# Altium footprint library lib_protel_HC.PCBLIB: 724 footprints (part 34 of 46)
Each footprint in its own frame and in the unit in brackets; x right, y up, seen from the top. Pads: shape width x height; smd on the part's side, far side on the other; paste and mask are expansions set on the pad; w line width, h text height; cw(c..) or ccw(c..) is an arc to the next point about the centre after c.
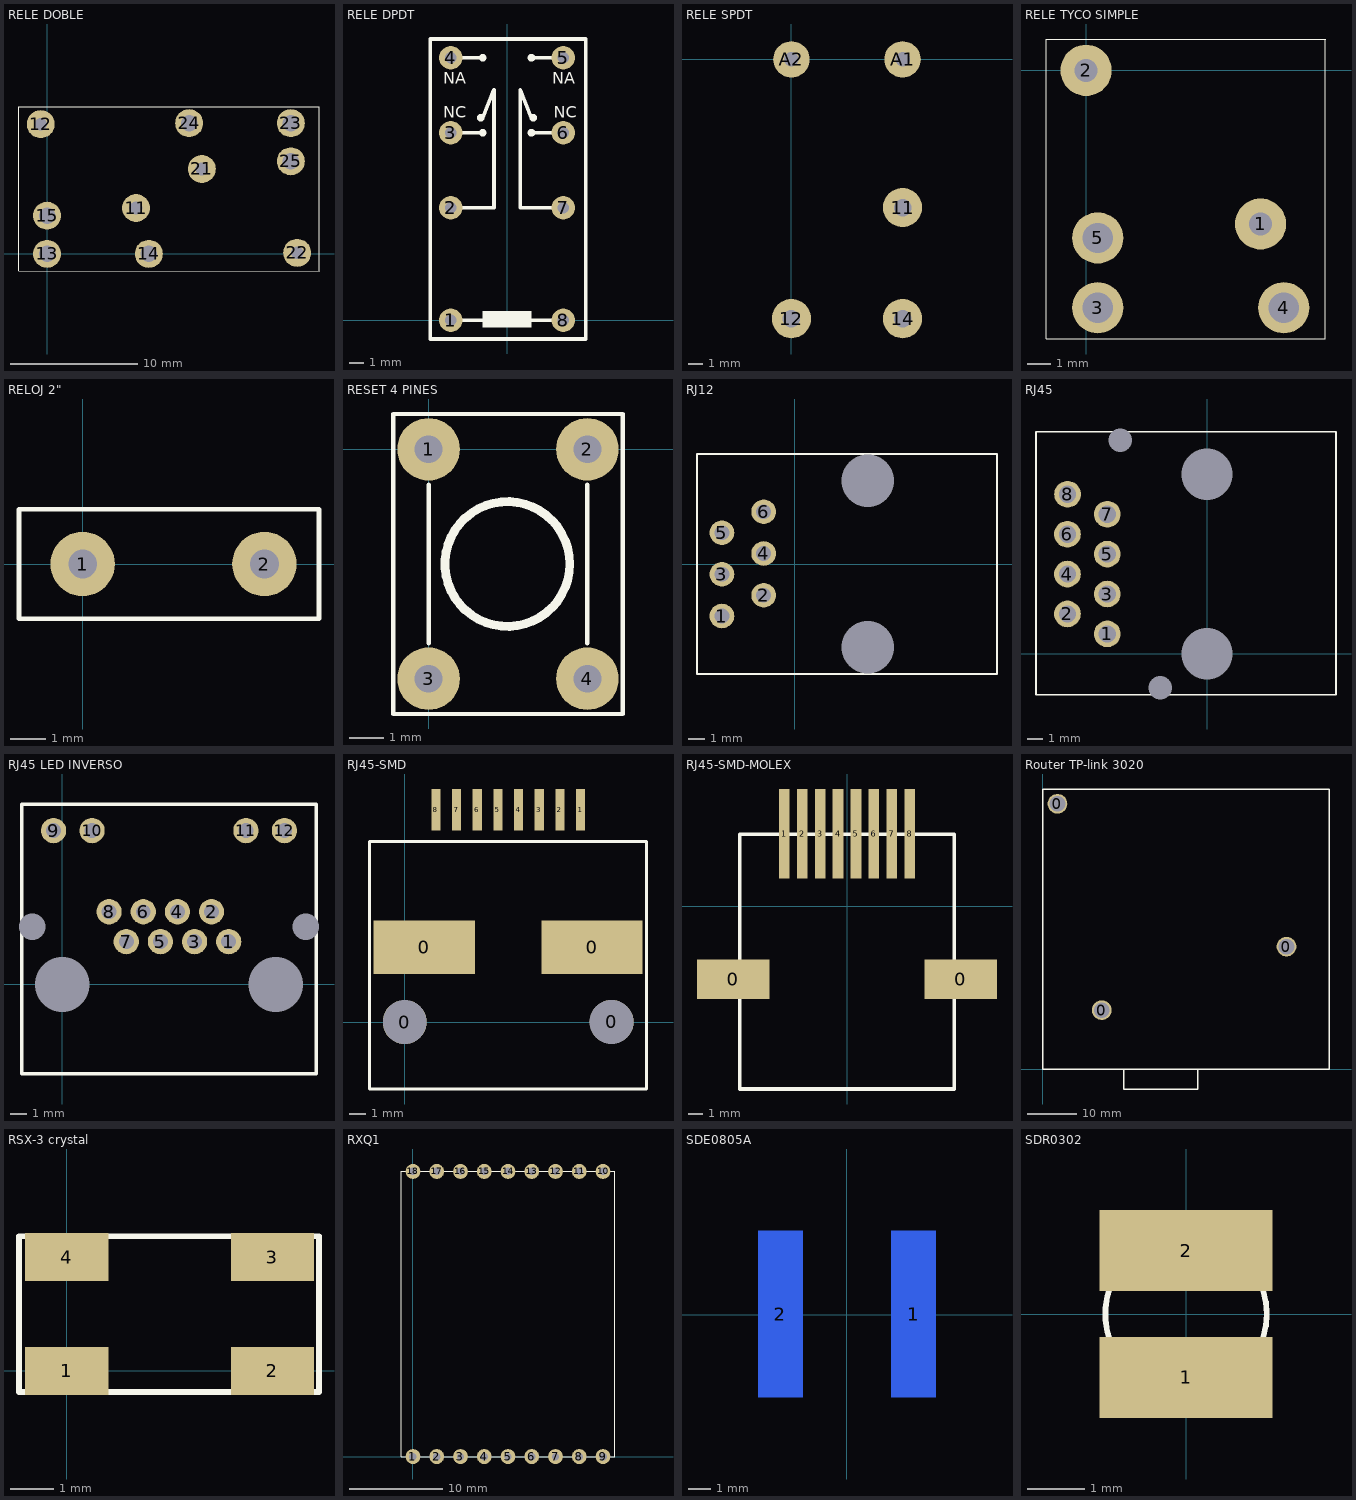
[diagram p33: the footprints below, top view; thin cyan lines are the x and y axes]

## RELE DOBLE [mm] "RELE DOBLE DE TYCO"
height 9.9
pads (10):
  round 2.2 hole 1: 11(7,3.6) 12(-0.5,10.2) 21(12.17,6.68) 22(19.67,0.08)
  round 2.2 hole 1.3: 13(0,0) 14(8,0) 15(0,3) 23(19.17,10.28) 24(11.17,10.28) 25(19.17,7.28)
Top Overlay:
  lines w0.051: 21.38,11.55 -2.21,11.55 -2.21,-1.34 21.385,-1.35 21.385,11.55

## RELE DPDT [mm]
pads (8):
  round 1.6 on Top hole 0.8: 1(-3.81,0) 2(-3.81,7.62) 3(-3.81,12.7) 4(-3.81,17.78) 5(3.81,17.78) 6(3.81,12.7) 7(3.81,7.62) 8(3.81,0)
Top Overlay:
  circle w0.254: c1.778,13.716 r0.127
  circle w0.254: c1.651,17.78 r0.127
  circle w0.254: c1.651,12.7 r0.127
  circle w0.254: c-1.778,13.716 r0.127
  circle w0.254: c-1.651,17.78 r0.127
  circle w0.254: c-1.651,12.7 r0.127
  rectangle: -1.651,-0.508 1.651,0.635
  lines w0.25: -3.81,0 3.81,0 ; -3.81,7.62 -0.889,7.62 -0.889,8.509 -0.889,15.621 -1.651,13.716 ; -3.81,12.7 -1.778,12.7 ; -3.81,17.78 -1.524,17.78 ; 1.524,17.78 3.81,17.78 ; 1.651,13.716 0.889,15.621 0.889,7.62 3.81,7.62 ; 1.778,12.7 3.81,12.7 ; -5.207,-1.27 5.334,-1.265 5.334,19.05 -5.207,19.05 -5.207,-1.27
  text "NA" at -4.318,16.002 h0.8
  text "NA" at 3.048,16.002 h0.8
  text "NC" at 3.175,13.716 h0.8
  text "NC" at -4.318,13.716 h0.8

## RELE SPDT [mm]
pads (5):
  round 2.7 hole 1.2: 11(7.62,-10.16) 12(0,-17.78) 14(7.62,-17.78)
  round 2.5 hole 1: A1(7.62,0) A2(0,0)
Bottom Overlay:
  lines w0.254: -0.01,-16.14 -0.01,-15.04 1.77,-15.04 ; 0.04,-1.57 0.04,-2.73 0.09,-2.78 2.49,-2.78 2.49,-4.15 5.05,-4.15 5.05,-1.26 2.49,-1.26 2.49,-2.72 ; 1.115,-14.675 5.62,-10.17 6.05,-10.17 ; 5.05,-2.75 7.59,-2.75 7.59,-1.59 ; 5.71,-15.06 7.49,-15.06 7.52,-15.03 7.52,-16.14 ; -1.4,-19.18 -1.4,1.4 9.02,1.4 9.02,-19.18 -1.4,-19.18
  text "A1" at 6.2,0.79 h1
  text "A2" at 2.41,0.81 h1
  text "11" at 8.07,-7.41 h1
  text "12" at 2.47,-17.21 h1
  text "14" at 5.89,-17.19 h1

## RELE TYCO SIMPLE [mm] "RELE SIMPLE DE TYCO"
height 9.9
pads (5):
  round 2.2 hole 1: 1(7.5,-6.6) 2(0,0)
  round 2.2 hole 1.3: 3(0.5,-10.2) 4(8.5,-10.2) 5(0.5,-7.2)
Top Overlay:
  lines w0.051: 10.29,1.35 10.29,-11.545 -1.71,-11.54 -1.71,1.35 10.3,1.35

## RELOJ 2" [mm]
pads (2):
  round 1.8 on Top hole 0.8: 1(0,0) 2(5.08,0)
Top Overlay:
  lines w0.127: -1.778,-1.524 6.604,-1.524 6.604,1.524 -1.778,1.524 -1.778,0 -1.778,-1.524

## RESET 4 PINES [mm] "RESET"
pads (4):
  round 1.8 on Top hole 0.8: 1(0,0) 2(4.572,0) 3(0,-6.604) 4(4.572,-6.604)
Top Overlay:
  circle w0.254: c2.268,-3.302 r1.796
  lines w0.127: 0,-5.588 0,-1.016 ; 4.572,-5.588 4.572,-1.016 ; -1.016,-7.62 -1.016,1.016 5.588,1.016 5.588,-7.62 -1.016,-7.62

## RJ12 [mm]
height 16.4
pads (8):
  rect 0x0 hole 3.2: 0(4.445,-5.08)
  round 0 hole 3.2: 0(4.445,5.08)
  round 1.5 hole 0.9: 1(-4.445,-3.17) 2(-1.905,-1.9) 3(-4.445,-0.63) 4(-1.905,0.64) 5(-4.445,1.91) 6(-1.905,3.18)
Top Overlay:
  lines w0.1: -5.965,-6.7 -5.965,6.7 12.315,6.7 12.315,-6.7 -5.965,-6.7

## RJ45 [mm]
height 16.4
pads (12):
  round 0 hole 1.5: 0(-5.54,13.595) 0(-3,-2.155)
  rect 0x0 hole 3.25: 0(0,0.005)
  round 0 hole 3.25: 0(0,11.435)
  round 1.7 hole 1.1: 1(-6.36,1.27) 2(-8.9,2.54) 3(-6.36,3.81) 4(-8.9,5.08) 5(-6.36,6.35) 6(-8.9,7.62) 7(-6.36,8.89) 8(-8.89,10.16)
Top Overlay:
  lines w0.1: -10.9,-2.603 8.2,-2.603 8.2,14.143 -10.9,14.143 -10.9,-2.603

## RJ45 LED INVERSO [mm] "RJ45 con LEDs INVERSO modelo CAT5"
height 14
pads (16):
  round 0 hole 1.57: 0(-1.78,3.43) 0(14.48,3.43)
  rect 0x0 hole 3.25: 0(0,0)
  round 0 hole 3.25: 0(12.7,0)
  round 1.5 hole 0.89: 1(9.9,2.54) 2(8.88,4.32) 3(7.87,2.54) 4(6.85,4.32) 5(5.84,2.54) 6(4.82,4.32) 7(3.81,2.54) 8(2.79,4.32) 9(-0.51,9.14) 10(1.78,9.14) 11(10.92,9.14) 12(13.21,9.14)
Top Overlay:
  lines w0.2: 15.098,-5.3 15.098,10.7 ; 15.1,-5.3 -2.4,-5.3 -2.4,10.7 15.1,10.7

## RJ45-SMD [mm] "RJ45 SMD ANGULO RECTO"
height 14
pads (12):
  round 2.7 hole 2.7: 0(0,0) 0(12.7,0.01)
  rect 6.22x3.3 smd: 0(1.205,4.6) 0(11.5,4.6)
  rect 0.56x2.54 smd: 1(10.8,13.04) 2(9.53,13.04) 3(8.26,13.04) 4(6.99,13.04) 5(5.72,13.04) 6(4.45,13.04) 7(3.18,13.04) 8(1.91,13.04)
Top Overlay:
  lines w0.17: -2.17,-4.11 14.85,-4.11
  lines w0.2: -2.17,-4.11 -2.17,11.09 14.85,11.09 14.85,-4.11

## RJ45-SMD-MOLEX [mm] "RJ45 TIPO SMD MOLEX 0855025008"
height 11.5
pads (10):
  rect 5.15x2.8 smd: 0(-8.075,-5.162) 0(8.075,-5.162)
  rect 0.76x6.35 smd: 1(-4.445,5.163) 2(-3.175,5.163) 3(-1.905,5.163) 4(-0.635,5.163) 5(0.635,5.163) 6(1.905,5.163) 7(3.175,5.163) 8(4.445,5.163)
Top Overlay:
  lines w0.254: -7.62,-12.962 -7.62,5.138 7.62,5.138 7.62,-12.962 -7.62,-12.962

## Router TP-link 3020 [mm]
height 16.5
pads (3):
  round 4 hole 3.2: 0(3,53.9) 0(12,12) 0(49.5,24.9)
Top Overlay:
  lines w0.3: 16.5,0 16.5,-4 31.5,-4 31.5,0 ; 0,0 58.2,0 58.2,56.9 0,56.9 0,0

## RSX-3 crystal [mm] "crystal de 32mhz de RAKON modelo RSX-3"
height 0.85
pads (4):
  rect 1.9x1.1 smd: 1(0,0) 2(4.7,0) 3(4.7,2.6) 4(0,2.6)
Top Overlay:
  lines w0.127: -1.092,-0.483 5.766,-0.483 5.766,3.073 -1.092,3.073 -1.092,-0.483

## RXQ1 [mm] "MODULO RF RXQ1 100 mil"
pads (18):
  round 1.6 on Top hole 0.8: 1(0,0) 2(2.54,0) 3(5.08,0) 4(7.62,0) 5(10.16,0) 6(12.7,0) 7(15.24,0) 8(17.78,0) 9(20.32,0) 10(20.32,30.48) 11(17.78,30.48) 12(15.24,30.48) 13(12.7,30.48) 14(10.16,30.48) 15(7.62,30.48) 16(5.08,30.48) 17(2.54,30.48) 18(0,30.48)
Top Overlay:
  lines w0.127: -1.27,0 -1.27,30.48 21.59,30.48 21.59,0 -1.27,0

## SDE0805A [mm]
pads (2):
  rect 2x7.5 smd far side: 1(3.01,0.026) 2(-2.99,0.026)
Bottom Overlay:
  lines w0.1: -1.83,-3.114 ccw(c0.011,0.026) -0.99,-3.474 1.01,-3.474 ccw(c0.01,0.026) 1.841,-3.12 ; -1.815,3.176 cw(c0.011,0.026) -0.99,3.526 1.01,3.526 cw(c0.01,0.026) 1.835,3.176
3D body "User Library-Inductor_SDE0805.STEP": height 5, standoff -0.02, extent -3.878,-3.474 3.899,3.526

## SDR0302 [mm] "FERRITA NFC"
height 2.5
pads (2):
  rect 3x1.4 smd mask+0.05: 1(0,-1.1) 2(0,1.1)
Top Overlay:
  circle w0.1: c0,0 r1.4